# Altium footprint library hand_ad_lib.PcbLib: 105 footprints (part 4 of 7)
Each footprint in its own frame and in the unit in brackets; x right, y up, seen from the top. Pads: shape width x height; smd on the part's side, far side on the other; paste and mask are expansions set on the pad; w line width, h text height; cw(c..) or ccw(c..) is an arc to the next point about the centre after c.
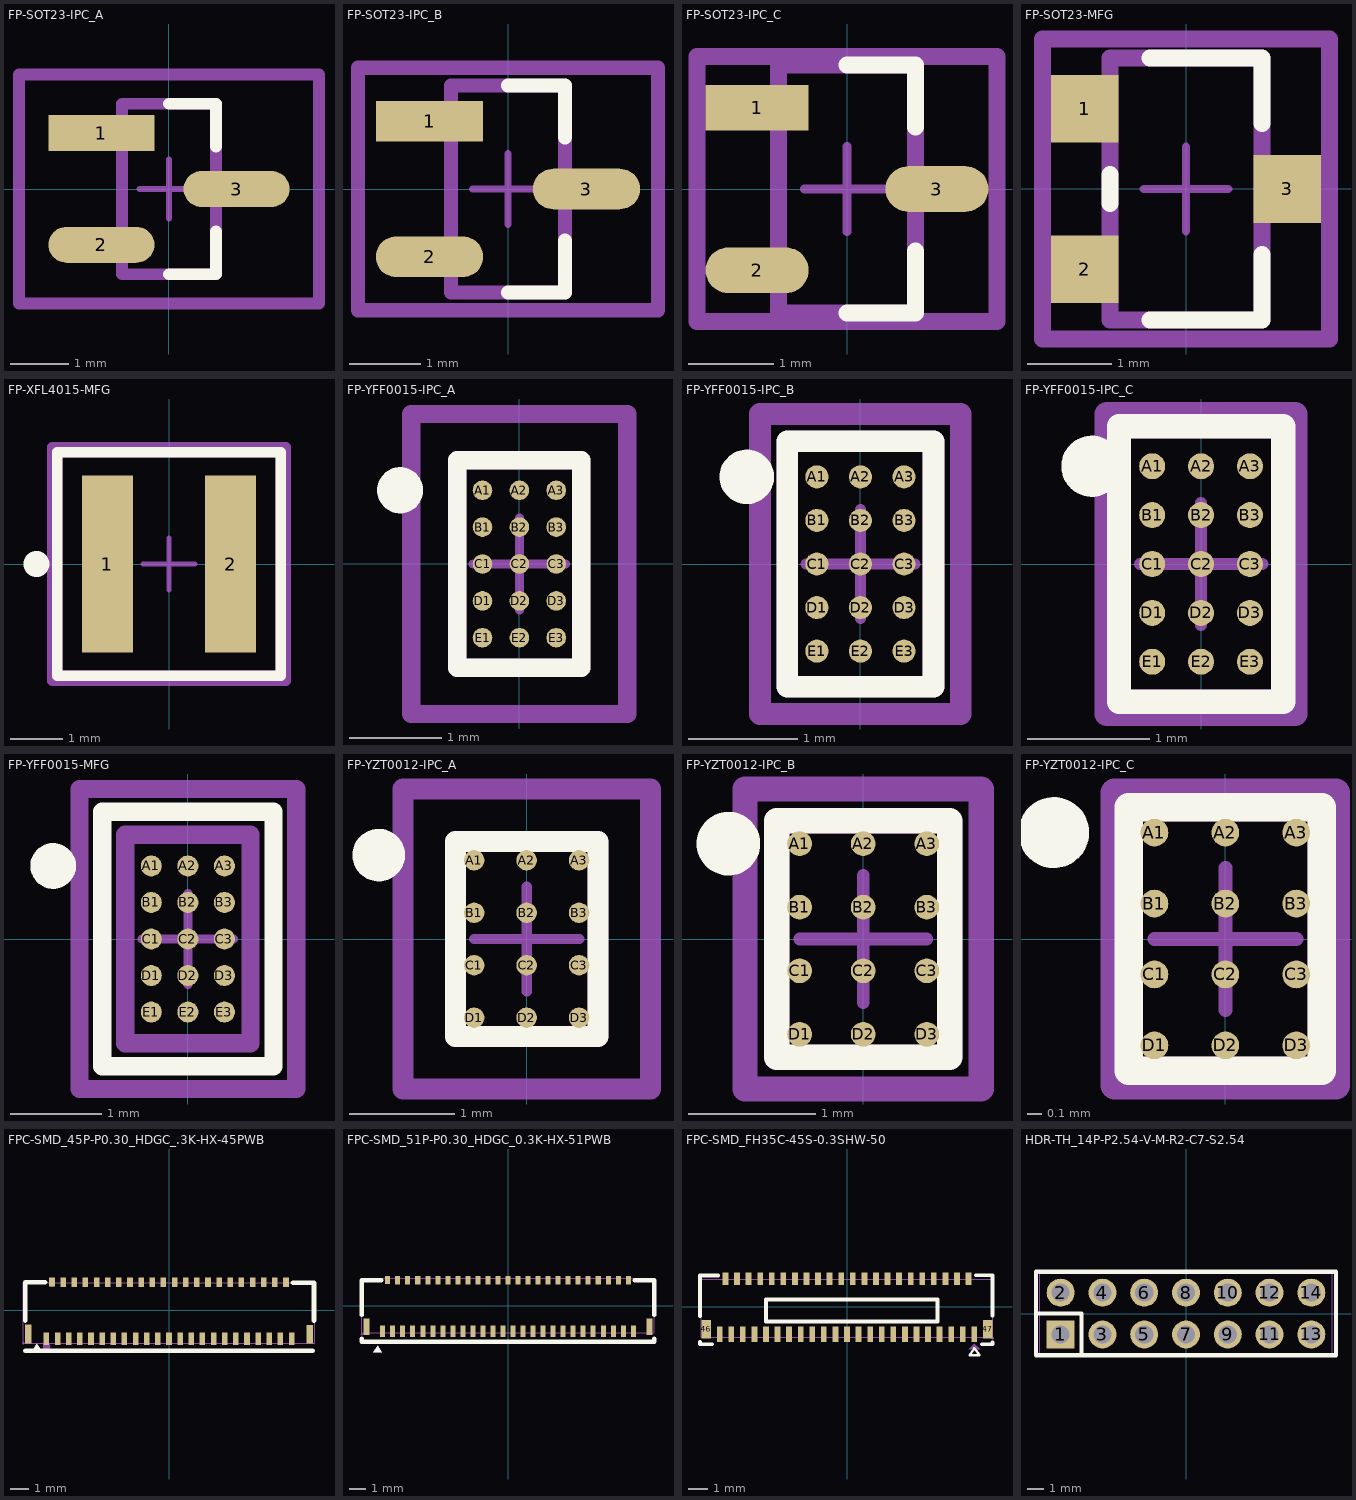
[diagram p3: the footprints below, top view; thin cyan lines are the x and y axes]

## FP-SOT23-IPC_A [mm]
pads (3):
  rect 1.805x0.612 smd paste+0 mask+0: 1(-1.15,0.95)
  rrect100% 1.805x0.612 smd paste+0 mask+0: 2(-1.15,-0.95) 3(1.15,0)
Top Overlay:
  lines w0.2: 0,-1.45 0.8,-1.45 0.8,-0.725 ; 0,1.45 0.8,1.45 0.8,0.725
Top 3D Body:
  lines w0.2: -0.8,-1.45 0.8,-1.45 0.8,1.45 -0.8,1.45 -0.8,-1.45
Top Courtyard:
  lines w0.2: -2.553,-1.95 2.553,-1.95 2.553,1.95 -2.553,1.95 -2.553,-1.95
Top Assembly:
  lines w0.2: -2.553,-1.95 2.553,-1.95 2.553,1.95 -2.553,1.95 -2.553,-1.95
  text ".Designator" at 0,-0.001 h1
Top Component Center:
  lines w0.1: -0.5,0 0.5,0 ; 0,-0.5 0,0.5
3D body "Trans_Alpha_&_Omega_Semiconductor_AO3400A_eec.STEP": height 0.25, standoff 0, extent -2.553,-1.95 2.553,1.95

## FP-SOT23-IPC_B [mm]
pads (3):
  rect 1.505x0.572 smd paste+0 mask+0: 1(-1.1,0.95)
  rrect100% 1.505x0.572 smd paste+0 mask+0: 2(-1.1,-0.95) 3(1.1,0)
Top Overlay:
  lines w0.2: 0,-1.45 0.8,-1.45 0.8,-0.725 ; 0,1.45 0.8,1.45 0.8,0.725
Top 3D Body:
  lines w0.2: -0.8,-1.45 0.8,-1.45 0.8,1.45 -0.8,1.45 -0.8,-1.45
Top Courtyard:
  lines w0.2: -2.103,-1.7 2.103,-1.7 2.103,1.7 -2.103,1.7 -2.103,-1.7
Top Assembly:
  lines w0.2: -2.103,-1.7 2.103,-1.7 2.103,1.7 -2.103,1.7 -2.103,-1.7
  text ".Designator" at 0,-0.001 h1
Top Component Center:
  lines w0.1: -0.5,0 0.5,0 ; 0,-0.5 0,0.5
3D body "Trans_Alpha_&_Omega_Semiconductor_AO3400A_eec.STEP": height 0.25, standoff 0, extent -2.103,-1.7 2.103,1.7

## FP-SOT23-IPC_C [mm]
pads (3):
  rect 1.205x0.532 smd paste+0 mask+0: 1(-1.05,0.95)
  rrect100% 1.205x0.532 smd paste+0 mask+0: 2(-1.05,-0.95) 3(1.05,0)
Top Overlay:
  lines w0.2: 0,-1.45 0.8,-1.45 0.8,-0.725 ; 0,1.45 0.8,1.45 0.8,0.725
Top 3D Body:
  lines w0.2: -0.8,-1.45 0.8,-1.45 0.8,1.45 -0.8,1.45 -0.8,-1.45
Top Courtyard:
  lines w0.2: -1.753,-1.55 1.753,-1.55 1.753,1.55 -1.753,1.55 -1.753,-1.55
Top Assembly:
  lines w0.2: -1.753,-1.55 1.753,-1.55 1.753,1.55 -1.753,1.55 -1.753,-1.55
  text ".Designator" at 0,-0.001 h1
Top Component Center:
  lines w0.1: -0.5,0 0.5,0 ; 0,-0.5 0,0.5
3D body "Trans_Alpha_&_Omega_Semiconductor_AO3400A_eec.STEP": height 0.25, standoff 0, extent -1.753,-1.55 1.753,1.55

## FP-SOT23-MFG [mm]
pads (3):
  rect 0.8x0.8 smd paste+0 mask+0: 1(-1.2,0.95) 2(-1.2,-0.95) 3(1.2,0)
Top Overlay:
  lines w0.2: -0.9,-0.175 -0.9,0.175 ; -0.425,-1.55 0.9,-1.55 0.9,-0.775 ; -0.425,1.55 0.9,1.55 0.9,0.775
Top 3D Body:
  lines w0.2: -0.9,-1.55 0.9,-1.55 0.9,1.55 -0.9,1.55 -0.9,-1.55
Top Courtyard:
  lines w0.2: -1.7,-1.777 1.7,-1.777 1.7,1.777 -1.7,1.777 -1.7,-1.777
Top Assembly:
  lines w0.2: -1.7,-1.777 1.7,-1.777 1.7,1.777 -1.7,1.777 -1.7,-1.777
  text ".Designator" at 0,-0.001 h1
Top Component Center:
  lines w0.1: -0.5,0 0.5,0 ; 0,-0.5 0,0.5
3D body "Trans_Alpha_&_Omega_Semiconductor_AO3400A_eec.STEP": height 0.25, standoff 0, extent -1.7,-1.777 1.7,1.777

## FP-XFL4015-MFG [mm]
pads (2):
  rect 0.98x3.4 smd paste+0 mask+0: 1(-1.185,0) 2(1.185,0)
Top Overlay:
  circle w0.25: c-2.55,0 r0.125
  lines w0.2: -2.15,-2.15 2.15,-2.15 2.15,2.15 -2.15,2.15 -2.15,-2.15
Top 3D Body:
  lines w0.2: -2.15,-2.15 2.15,-2.15 2.15,2.15 -2.15,2.15 -2.15,-2.15
Top Courtyard:
  lines w0.2: -2.25,-2.25 2.25,-2.25 2.25,2.25 -2.25,2.25 -2.25,-2.25
Top Assembly:
  lines w0.2: -2.25,-2.25 2.25,-2.25 2.25,2.25 -2.25,2.25 -2.25,-2.25
  text ".Designator" at 0,0.188 h1
Top Component Center:
  lines w0.1: -0.5,0 0.5,0 ; 0,-0.5 0,0.5
3D body "Ind_Coilcraft_XFL4015-471MEB_eec.STEP": height 0.25, standoff 0, extent -2.25,-2.25 2.25,2.25

## FP-YFF0015-IPC_A [mm]
pads (15):
  round 0.212 smd paste+0 mask+0: A1(-0.4,0.8) A2(0,0.8) A3(0.4,0.8) B1(-0.4,0.4) B2(0,0.4) B3(0.4,0.4) C1(-0.4,0) C2(0,0) C3(0.4,0) D1(-0.4,-0.4) D2(0,-0.4) D3(0.4,-0.4) E1(-0.4,-0.8) E2(0,-0.8) E3(0.4,-0.8)
Top Overlay:
  circle w0.25: c-1.294,0.8 r0.125
  lines w0.2: -0.672,-1.128 0.672,-1.128 0.672,1.128 -0.672,1.128 -0.672,-1.128
Top 3D Body:
  lines w0.2: -0.672,-1.128 0.672,-1.128 0.672,1.128 -0.672,1.128 -0.672,-1.128
Top Courtyard:
  lines w0.2: -1.172,-1.627 1.172,-1.627 1.172,1.627 -1.172,1.627 -1.172,-1.627
Top Assembly:
  lines w0.2: -1.172,-1.627 1.172,-1.627 1.172,1.627 -1.172,1.627 -1.172,-1.627
  text ".Designator" at 0,0.188 h1
Top Component Center:
  lines w0.1: -0.5,0 0.5,0 ; 0,-0.5 0,0.5
3D body "IC_Texas_Instruments_TPS63805YFFR_eec.STEP": height 0.25, standoff 0, extent -1.172,-1.627 1.172,1.627

## FP-YFF0015-IPC_B [mm]
pads (15):
  round 0.212 smd paste+0 mask+0: A1(-0.4,0.8) A2(0,0.8) A3(0.4,0.8) B1(-0.4,0.4) B2(0,0.4) B3(0.4,0.4) C1(-0.4,0) C2(0,0) C3(0.4,0) D1(-0.4,-0.4) D2(0,-0.4) D3(0.4,-0.4) E1(-0.4,-0.8) E2(0,-0.8) E3(0.4,-0.8)
Top Overlay:
  circle w0.25: c-1.044,0.8 r0.125
  lines w0.2: -0.672,-1.128 0.672,-1.128 0.672,1.128 -0.672,1.128 -0.672,-1.128
Top 3D Body:
  lines w0.2: -0.672,-1.128 0.672,-1.128 0.672,1.128 -0.672,1.128 -0.672,-1.128
Top Courtyard:
  lines w0.2: -0.922,-1.378 0.922,-1.378 0.922,1.378 -0.922,1.378 -0.922,-1.378
Top Assembly:
  lines w0.2: -0.922,-1.378 0.922,-1.378 0.922,1.378 -0.922,1.378 -0.922,-1.378
  text ".Designator" at 0,0.188 h1
Top Component Center:
  lines w0.1: -0.5,0 0.5,0 ; 0,-0.5 0,0.5
3D body "IC_Texas_Instruments_TPS63805YFFR_eec.STEP": height 0.25, standoff 0, extent -0.922,-1.378 0.922,1.378

## FP-YFF0015-IPC_C [mm]
pads (15):
  round 0.212 smd paste+0 mask+0: A1(-0.4,0.8) A2(0,0.8) A3(0.4,0.8) B1(-0.4,0.4) B2(0,0.4) B3(0.4,0.4) C1(-0.4,0) C2(0,0) C3(0.4,0) D1(-0.4,-0.4) D2(0,-0.4) D3(0.4,-0.4) E1(-0.4,-0.8) E2(0,-0.8) E3(0.4,-0.8)
Top Overlay:
  circle w0.25: c-0.894,0.8 r0.125
  lines w0.2: -0.672,-1.128 -0.672,1.128 0.672,1.128 0.672,-1.128 -0.672,-1.128
Top 3D Body:
  lines w0.2: -0.672,-1.128 -0.672,1.128 0.672,1.128 0.672,-1.128 -0.672,-1.128
Top Courtyard:
  lines w0.2: -0.772,-1.228 -0.772,1.228 0.772,1.228 0.772,-1.228 -0.772,-1.228
Top Assembly:
  lines w0.2: -0.772,-1.228 -0.772,1.228 0.772,1.228 0.772,-1.228 -0.772,-1.228
  text ".Designator" at 0,0.188 h1
Top Component Center:
  lines w0.1: -0.5,0 0.5,0 ; 0,-0.5 0,0.5
3D body "IC_Texas_Instruments_TPS63805YFFR_eec.STEP": height 0.25, standoff 0, extent -0.772,-1.228 0.772,1.228

## FP-YFF0015-MFG [mm]
pads (15):
  round 0.23 smd paste-1000 mask-1000: A1(-0.4,0.8) A2(0,0.8) A3(0.4,0.8) B1(-0.4,0.4) B2(0,0.4) B3(0.4,0.4) C1(-0.4,0) C2(0,0) C3(0.4,0) D1(-0.4,-0.4) D2(0,-0.4) D3(0.4,-0.4) E1(-0.4,-0.8) E2(0,-0.8) E3(0.4,-0.8)
Top Overlay:
  circle w0.25: c-1.475,0.8 r0.125
  lines w0.2: -0.937,-1.392 -0.937,1.392 0.937,1.392 0.937,-1.392 -0.937,-1.392
Top Paste:
  drawing of 15 lines, arcs and shapes, not listed
Top Solder:
  circle w0.165: c0,-0.8 r0.082
  circle w0.165: c0,-0.4 r0.082
  circle w0.165: c0,0 r0.082
  circle w0.165: c0,0.4 r0.082
  circle w0.165: c0,0.8 r0.082
  circle w0.165: c0.4,-0.8 r0.082
  circle w0.165: c0.4,-0.4 r0.082
  circle w0.165: c0.4,0 r0.082
  circle w0.165: c0.4,0.4 r0.082
  circle w0.165: c0.4,0.8 r0.082
  circle w0.165: c-0.4,-0.8 r0.082
  circle w0.165: c-0.4,-0.4 r0.082
  circle w0.165: c-0.4,0 r0.082
  circle w0.165: c-0.4,0.4 r0.082
  circle w0.165: c-0.4,0.8 r0.082
Top 3D Body:
  lines w0.2: -0.687,-1.142 -0.687,1.142 0.687,1.142 0.687,-1.142 -0.687,-1.142
Top Courtyard:
  lines w0.2: -1.187,-1.643 -1.187,1.643 1.187,1.643 1.187,-1.643 -1.187,-1.643
Top Assembly:
  lines w0.2: -1.187,-1.643 -1.187,1.643 1.187,1.643 1.187,-1.643 -1.187,-1.643
  text ".Designator" at 0,0.188 h1
Top Component Center:
  lines w0.1: -0.5,0 0.5,0 ; 0,-0.5 0,0.5
3D body "IC_Texas_Instruments_TPS63805YFFR_eec.STEP": height 0.25, standoff 0, extent -1.187,-1.643 1.187,1.643

## FP-YZT0012-IPC_A [mm]
pads (12):
  round 0.196 smd paste+0 mask+0: A1(-0.5,0.75) A2(0,0.75) A3(0.5,0.75) B1(-0.5,0.25) B2(0,0.25) B3(0.5,0.25) C1(-0.5,-0.25) C2(0,-0.25) C3(0.5,-0.25) D1(-0.5,-0.75) D2(0,-0.75) D3(0.5,-0.75)
Top Overlay:
  circle w0.25: c-1.41,0.8 r0.125
  lines w0.2: -0.68,-0.93 -0.68,0.93 0.68,0.93 0.68,-0.93 -0.68,-0.93
Top 3D Body:
  lines w0.2: -0.68,-0.93 -0.68,0.93 0.68,0.93 0.68,-0.93 -0.68,-0.93
Top Courtyard:
  lines w0.2: -1.18,-1.43 -1.18,1.43 1.18,1.43 1.18,-1.43 -1.18,-1.43
Top Assembly:
  lines w0.2: -1.18,-1.43 -1.18,1.43 1.18,1.43 1.18,-1.43 -1.18,-1.43
  text ".Designator" at 0,0.188 h1
Top Component Center:
  lines w0.1: -0.5,0 0.5,0 ; 0,-0.5 0,0.5
3D body "IC_Texas_Instruments_TXB0104YZTR_eec.STEP": height 0.25, standoff 0, extent -1.18,-1.43 1.18,1.43

## FP-YZT0012-IPC_B [mm]
pads (12):
  round 0.196 smd paste+0 mask+0: A1(-0.5,0.75) A2(0,0.75) A3(0.5,0.75) B1(-0.5,0.25) B2(0,0.25) B3(0.5,0.25) C1(-0.5,-0.25) C2(0,-0.25) C3(0.5,-0.25) D1(-0.5,-0.75) D2(0,-0.75) D3(0.5,-0.75)
Top Overlay:
  circle w0.25: c-1.06,0.75 r0.125
  lines w0.2: -0.68,-0.93 0.68,-0.93 0.68,0.93 -0.68,0.93 -0.68,-0.93
Top 3D Body:
  lines w0.2: -0.68,-0.93 0.68,-0.93 0.68,0.93 -0.68,0.93 -0.68,-0.93
Top Courtyard:
  lines w0.2: -0.93,-1.18 0.93,-1.18 0.93,1.18 -0.93,1.18 -0.93,-1.18
Top Assembly:
  lines w0.2: -0.93,-1.18 0.93,-1.18 0.93,1.18 -0.93,1.18 -0.93,-1.18
  text ".Designator" at 0,0.188 h1
Top Component Center:
  lines w0.1: -0.5,0 0.5,0 ; 0,-0.5 0,0.5
3D body "IC_Texas_Instruments_TXB0104YZTR_eec.STEP": height 0.25, standoff 0, extent -0.93,-1.18 0.93,1.18

## FP-YZT0012-IPC_C [mm]
pads (12):
  round 0.196 smd paste+0 mask+0: A1(-0.5,0.75) A2(0,0.75) A3(0.5,0.75) B1(-0.5,0.25) B2(0,0.25) B3(0.5,0.25) C1(-0.5,-0.25) C2(0,-0.25) C3(0.5,-0.25) D1(-0.5,-0.75) D2(0,-0.75) D3(0.5,-0.75)
Top Overlay:
  circle w0.25: c-1.21,0.75 r0.125
  lines w0.2: -0.68,-0.93 -0.68,0.93 0.68,0.93 0.68,-0.93 -0.68,-0.93
Top 3D Body:
  lines w0.2: -0.68,-0.93 -0.68,0.93 0.68,0.93 0.68,-0.93 -0.68,-0.93
Top Courtyard:
  lines w0.2: -0.78,-1.03 -0.78,1.03 0.78,1.03 0.78,-1.03 -0.78,-1.03
Top Assembly:
  lines w0.2: -0.78,-1.03 -0.78,1.03 0.78,1.03 0.78,-1.03 -0.78,-1.03
  text ".Designator" at 0,0.188 h1
Top Component Center:
  lines w0.1: -0.5,0 0.5,0 ; 0,-0.5 0,0.5
3D body "IC_Texas_Instruments_TXB0104YZTR_eec.STEP": height 0.25, standoff 0, extent -0.78,-1.03 0.78,1.03

## FPC-SMD_45P-P0.30_HDGC_.3K-HX-45PWB [mm]
pads (47):
  rect 0.3x0.67 smd paste+0 mask+0.05: 1(-6.6,-1.533) 3(-6,-1.533) 5(-5.4,-1.533) 7(-4.8,-1.533) 9(-4.2,-1.533) 11(-3.6,-1.533) 13(-3,-1.533) 15(-2.4,-1.533) 17(-1.8,-1.533) 19(-1.2,-1.533) 21(-0.6,-1.533) 23(0,-1.533) 25(0.6,-1.533) 27(1.2,-1.533) 29(1.8,-1.533) 31(2.4,-1.533) 33(3,-1.533) 35(3.6,-1.533) 37(4.2,-1.533) 39(4.8,-1.533) 41(5.4,-1.533) 43(6,-1.533) 45(6.6,-1.533)
  rect 0.3x0.5 smd paste+0 mask+0.05: 2(-6.3,1.533) 4(-5.7,1.527) 6(-5.1,1.527) 8(-4.5,1.527) 10(-3.9,1.527) 12(-3.3,1.527) 14(-2.7,1.527) 16(-2.1,1.527) 18(-1.5,1.527) 20(-0.9,1.527) 22(-0.3,1.527) 24(0.3,1.527) 26(0.9,1.527) 28(1.5,1.527) 30(2.1,1.527) 32(2.7,1.527) 34(3.3,1.527) 36(3.9,1.527) 38(4.5,1.527) 40(5.1,1.527) 42(5.7,1.527) 44(6.3,1.527)
  rect 0.35x1 smd paste+0 mask+0.05: 46(7.575,-1.268) 47(-7.575,-1.267)
Top Overlay:
  region: -7.11,-1.778 -7.364,-2.159 -6.856,-2.159
  lines w0.254: -7.745,-2.16 7.745,-2.16 ; -7.745,-0.536 -7.745,1.524 -6.681,1.524 ; 6.681,1.5 7.8,1.5 7.8,-0.542
Mechanical 6:
  circle w0.2: c-6.593,-1.943 r0.1
Mechanical 15:
  drawing of 52 lines, arcs and shapes, not listed

## FPC-SMD_51P-P0.30_HDGC_0.3K-HX-51PWB [mm]
pads (53):
  rect 0.3x0.67 smd paste+0 mask+0.05: 1(-7.5,-1.533) 3(-6.9,-1.533) 5(-6.3,-1.533) 7(-5.7,-1.533) 9(-5.1,-1.533) 11(-4.5,-1.533) 13(-3.9,-1.533) 15(-3.3,-1.533) 17(-2.7,-1.533) 19(-2.1,-1.533) 21(-1.5,-1.533) 23(-0.9,-1.533) 25(-0.3,-1.533) 27(0.3,-1.533) 29(0.9,-1.533) 31(1.5,-1.533) 33(2.1,-1.533) 35(2.7,-1.533) 37(3.3,-1.533) 39(3.9,-1.533) 41(4.5,-1.533) 43(5.1,-1.533) 45(5.7,-1.533) 47(6.3,-1.533) 49(6.9,-1.533) 51(7.5,-1.533)
  rect 0.3x0.5 smd paste+0 mask+0.05: 2(-7.2,1.533) 4(-6.6,1.527) 6(-6,1.527) 8(-5.4,1.527) 10(-4.8,1.527) 12(-4.2,1.527) 14(-3.6,1.527) 16(-3,1.527) 18(-2.4,1.527) 20(-1.8,1.527) 22(-1.2,1.527) 24(-0.6,1.527) 26(0,1.527) 28(0.6,1.527) 30(1.2,1.527) 32(1.8,1.527) 34(2.4,1.527) 36(3,1.527) 38(3.6,1.527) 40(4.2,1.527) 42(4.8,1.527) 44(5.4,1.527) 46(6,1.527) 48(6.6,1.527) 50(7.2,1.527)
  rect 0.35x1 smd paste+0 mask+0.05: 52(8.475,-1.268) 53(-8.475,-1.267)
Top Overlay:
  region: -7.8,-2.4 -8.054,-2.781 -7.546,-2.781
  lines w0.254: -8.75,-2.16 -8.75,-1.975 ; -8.75,-0.559 -8.75,-0.536 -8.75,1.524 -7.581,1.524 ; -8.645,-2.16 8.645,-2.16 ; 7.581,1.524 8.645,1.524 ; 8.75,-2.16 8.75,-1.976 ; 8.75,-0.559 8.75,-0.536 8.75,1.524
Mechanical 6:
  region: -7.8,-2.4 -8.054,-2.781 -7.546,-2.781
Mechanical 15:
  drawing of 58 lines, arcs and shapes, not listed
3D body "0.3K-HX-51PWB.x_t": height 1.03, standoff 0, extent -8.75,-1.732 8.75,2.198

## FPC-SMD_FH35C-45S-0.3SHW-50 [mm]
pads (47):
  rect 0.3x0.8 smd: 1(6.6,-1.438) 3(6,-1.438) 5(5.4,-1.438) 7(4.8,-1.438) 9(4.2,-1.438) 11(3.6,-1.437) 13(3,-1.438) 15(2.4,-1.438) 17(1.8,-1.438) 19(1.2,-1.438) 21(0.6,-1.438) 23(0,-1.438) 25(-0.6,-1.438) 27(-1.2,-1.438) 29(-1.8,-1.438) 31(-2.4,-1.438) 33(-3,-1.438) 35(-3.6,-1.438) 37(-4.2,-1.438) 39(-4.8,-1.438) 41(-5.4,-1.438) 43(-6,-1.438) 45(-6.6,-1.438)
  rect 0.3x0.65 smd: 2(6.3,1.438) 4(5.7,1.438) 6(5.1,1.438) 8(4.5,1.438) 10(3.9,1.438) 12(3.3,1.438) 14(2.7,1.438) 16(2.1,1.438) 18(1.5,1.438) 20(0.9,1.438) 22(0.3,1.438) 24(-0.3,1.438) 26(-0.9,1.438) 28(-1.5,1.438) 30(-2.1,1.438) 32(-2.7,1.438) 34(-3.3,1.438) 36(-3.9,1.438) 38(-4.5,1.438) 40(-5.1,1.438) 42(-5.7,1.438) 44(-6.3,1.438)
  rect 0.5x0.95 smd: 46(-7.3,-1.162) 47(7.3,-1.162)
Top Overlay:
  lines w0.127: 6.35,-2.512 6.86,-2.522 6.86,-2.509 6.6,-2.162 6.35,-2.512
  lines w0.2: -7.616,-1.837 -7.616,-1.946 -6.981,-1.946 ; -7.616,-0.488 -7.616,1.61 -6.681,1.61 ; 6.681,1.628 7.55,1.628 7.55,-0.462 ; 6.989,-1.946 7.55,-1.946 7.55,-1.863 ; -4.191,-0.775 -4.191,0.368 4.699,0.368 4.699,-0.775 -4.191,-0.775
Mechanical 6:
  region: 6.9,-2.212 6.3,-2.212 6.6,-1.912
Mechanical 15:
  drawing of 52 lines, arcs and shapes, not listed
3D body "FH35C-45S-0.3SHW(50).x_t": height 0.91, standoff 0, extent -7.55,-1.612 7.55,2.588

## HDR-TH_14P-P2.54-V-M-R2-C7-S2.54 [mm]
pads (14):
  rect 1.7x1.7 hole 1.1: 1(-7.62,-1.27)
  round 1.7 hole 1.1: 2(-7.62,1.27) 3(-5.08,-1.27) 4(-5.08,1.27) 5(-2.54,-1.27) 6(-2.54,1.27) 7(0,-1.27) 8(0,1.27) 9(2.54,-1.27) 10(2.54,1.27) 11(5.08,-1.27) 12(5.08,1.27) 13(7.62,-1.27) 14(7.62,1.27)
Top Overlay:
  lines w0.254: -9.12,0.007 -6.35,0.007 -6.35,-2.54 ; -9.12,-2.54 -9.12,2.54 9.12,2.54 9.12,-2.54 -9.12,-2.54
Mechanical 15:
  region: -7.94,-0.95 -7.3,-0.95 -7.3,-1.59 -7.94,-1.59
  region: -7.94,1.59 -7.3,1.59 -7.3,0.95 -7.94,0.95
  region: -5.4,-0.95 -4.76,-0.95 -4.76,-1.59 -5.4,-1.59
  region: -5.4,1.59 -4.76,1.59 -4.76,0.95 -5.4,0.95
  region: -2.86,-0.95 -2.22,-0.95 -2.22,-1.59 -2.86,-1.59
  region: -2.86,1.59 -2.22,1.59 -2.22,0.95 -2.86,0.95
  region: -0.32,-0.95 0.32,-0.95 0.32,-1.59 -0.32,-1.59
  region: -0.32,1.59 0.32,1.59 0.32,0.95 -0.32,0.95
  region: 2.22,-0.95 2.86,-0.95 2.86,-1.59 2.22,-1.59
  region: 2.22,1.59 2.86,1.59 2.86,0.95 2.22,0.95
  region: 4.76,-0.95 5.4,-0.95 5.4,-1.59 4.76,-1.59
  region: 4.76,1.59 5.4,1.59 5.4,0.95 4.76,0.95
  region: 7.3,-0.95 7.94,-0.95 7.94,-1.59 7.3,-1.59
  region: 7.3,1.59 7.94,1.59 7.94,0.95 7.3,0.95
  region: -8.83,-2.54 -8.83,-2.515 -8.865,-2.48 -8.915,-2.48 -8.95,-2.515 -8.95,-2.54 -8.95,-2.565 -8.915,-2.6 -8.865,-2.6 -8.83,-2.565
  lines w0.051: -8.89,-2.54 -8.89,2.54 8.89,2.54 8.89,-2.54 -8.89,-2.54
3D body "PH2.54-2x7.x_t": height 8.54, standoff -3, extent -8.89,-2.54 8.9,2.54